# Altium footprint library Espressif.PcbLib: 20 footprints (part 2 of 2)
Each footprint in its own frame and in the unit in brackets; x right, y up, seen from the top. Pads: shape width x height; smd on the part's side, far side on the other; paste and mask are expansions set on the pad; w line width, h text height; cw(c..) or ccw(c..) is an arc to the next point about the centre after c.
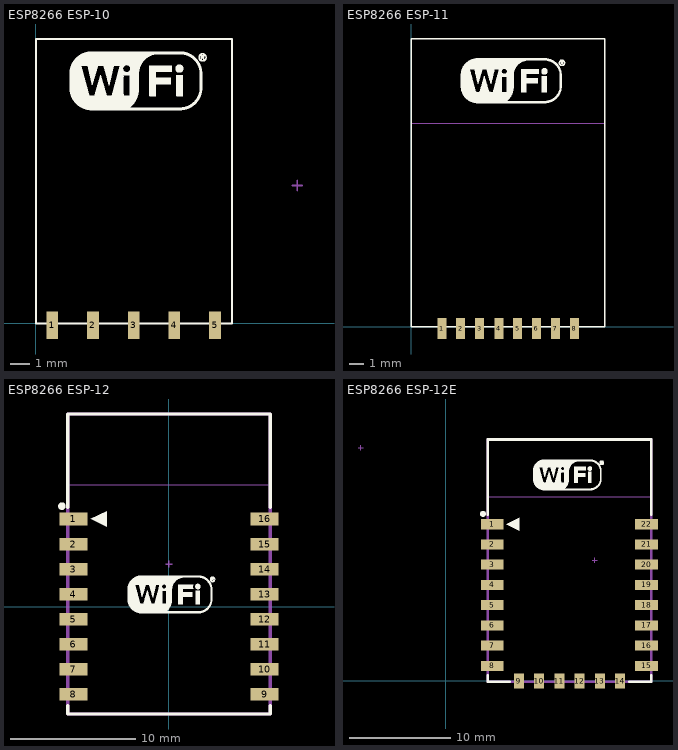
[diagram p1: the footprints below, top view; thin cyan lines are the x and y axes]

## ESP8266 ESP-10 [mm] "ESP8266 ESP-10"
pads (5):
  rect 0.6x1.4 smd: 1(0.838,-0.102) 2(2.915,-0.102) 3(4.991,-0.102) 4(7.068,-0.102) 5(9.144,-0.102)
Top Overlay:
  drawing of 1264 lines, arcs and shapes, not listed
  text ".Designator" at 0,-1.803 h1
Mechanical 15:
  lines w0.1: 13.081,7.034 13.589,7.034 ; 13.335,6.78 13.335,7.288
3D body: height 1, standoff 0.5, extent 0.914,1.676 3.175,4.14
3D body: height 1, standoff 0.5, extent 0.889,5.41 5.385,9.728
3D body: height 0.5, standoff 0, extent 0,0 10.008,14.478

## ESP8266 ESP-11 [mm] "ESP8266 ESP-11"
pads (8):
  rect 0.6x1.4 smd: 1(2.057,-0.127) 2(3.327,-0.127) 3(4.597,-0.127) 4(5.893,-0.127) 5(7.137,-0.127) 6(8.407,-0.127) 7(9.677,-0.127) 8(10.947,-0.127)
Top Overlay:
  drawing of 1264 lines, arcs and shapes, not listed
  text ".Designator" at 0,-1.93 h1
Mechanical 13:
  lines w0.051: 0.026,13.639 13,13.64
  text "CUTOUT POLYGON" at 0.28,18.278 h0.25
  text "ANTENNA AREA" at 0.28,18.786 h0.25
Mechanical 15:
  lines w0.1: 6.35,17.346 6.858,17.346 ; 6.604,17.092 6.604,17.6
3D body: height 0.5, standoff 0, extent 0,0 13.005,19.304
3D body: height 1, standoff 0.5, extent 2.718,7.671 7.214,11.989
3D body: height 1, standoff 0.5, extent 2.743,3.937 5.004,6.401

## ESP8266 ESP-12 [mm] "ESP8266 ESP-12"
height 3.2
pads (16):
  rect 2.25x1 smd: 1(-7.625,7) 2(-7.625,5) 3(-7.625,3) 4(-7.625,1) 5(-7.625,-1) 6(-7.625,-3) 7(-7.625,-5) 8(-7.625,-7) 9(7.625,-7) 10(7.625,-5) 11(7.625,-3) 12(7.625,-1) 13(7.625,1) 14(7.625,3) 15(7.625,5) 16(7.625,7)
Top Overlay:
  drawing of 1268 lines, arcs and shapes, not listed
  text ".Designator" at -8.433,-9.398 h1
Mechanical 13:
  lines w0.051: -8.127,9.727 -8.127,15.382 8.129,15.382 8.129,9.727 -8.127,9.727
  lines w0.254: -8.084,-8.568 8.084,-8.568 8.084,15.371 -8.084,15.371 -8.084,-8.568
  text "CUTOUT POLYGON" at -7.873,14.366 h0.25
  text "ANTENNA AREA" at -7.873,14.874 h0.25
Mechanical 15:
  lines w0.1: -0.254,3.402 0.254,3.402 ; 0,3.148 0,3.656
3D body "ESP_12_ENew.STEP": height 3.82, standoff -0.05, extent -7.859,-8.522 8.156,15.509

## ESP8266 ESP-12E [mm] "ESP8266 ESP-12-E"
pads (22):
  rect 2.25x1 smd: 1(4.617,15.494) 2(4.617,13.494) 3(4.617,11.494) 4(4.617,9.494) 5(4.617,7.494) 6(4.617,5.494) 7(4.617,3.494) 8(4.617,1.494) 15(19.867,1.494) 16(19.867,3.494) 17(19.867,5.494) 18(19.867,7.494) 19(19.867,9.494) 20(19.867,11.494) 21(19.867,13.494) 22(19.867,15.494)
  rect 1x1.5 smd: 9(7.242,-0.006) 10(9.242,-0.006) 11(11.242,-0.006) 12(13.242,-0.006) 13(15.242,-0.006) 14(17.242,-0.006)
Top Overlay:
  drawing of 1269 lines, arcs and shapes, not listed
  text ".Designator" at 2.159,0.559 h1
Mechanical 13:
  lines w0.051: 4.115,18.221 4.115,23.876 20.371,23.876 20.371,18.221 4.115,18.221
  lines w0.254: 4.158,-0.074 20.326,-0.074 20.326,23.865 4.158,23.865 4.158,-0.074
  text "CUTOUT POLYGON" at 4.369,22.86 h0.25
  text "ANTENNA AREA" at 4.369,23.368 h0.25
Mechanical 15:
  lines w0.1: -8.661,23.061 -8.153,23.061 ; -8.407,22.807 -8.407,23.315 ; 14.477,11.921 14.985,11.921 ; 14.731,11.667 14.731,12.175
3D body "ESP_12_E.STEP": height 2.75, standoff 0.04, extent 4.243,0.003 20.243,24.003